# Altium footprint library LCD.PcbLib: 27 footprints (part 1 of 2)
Each footprint in its own frame and in the unit in brackets; x right, y up, seen from the top. Pads: shape width x height; smd on the part's side, far side on the other; paste and mask are expansions set on the pad; w line width, h text height; cw(c..) or ccw(c..) is an arc to the next point about the centre after c.
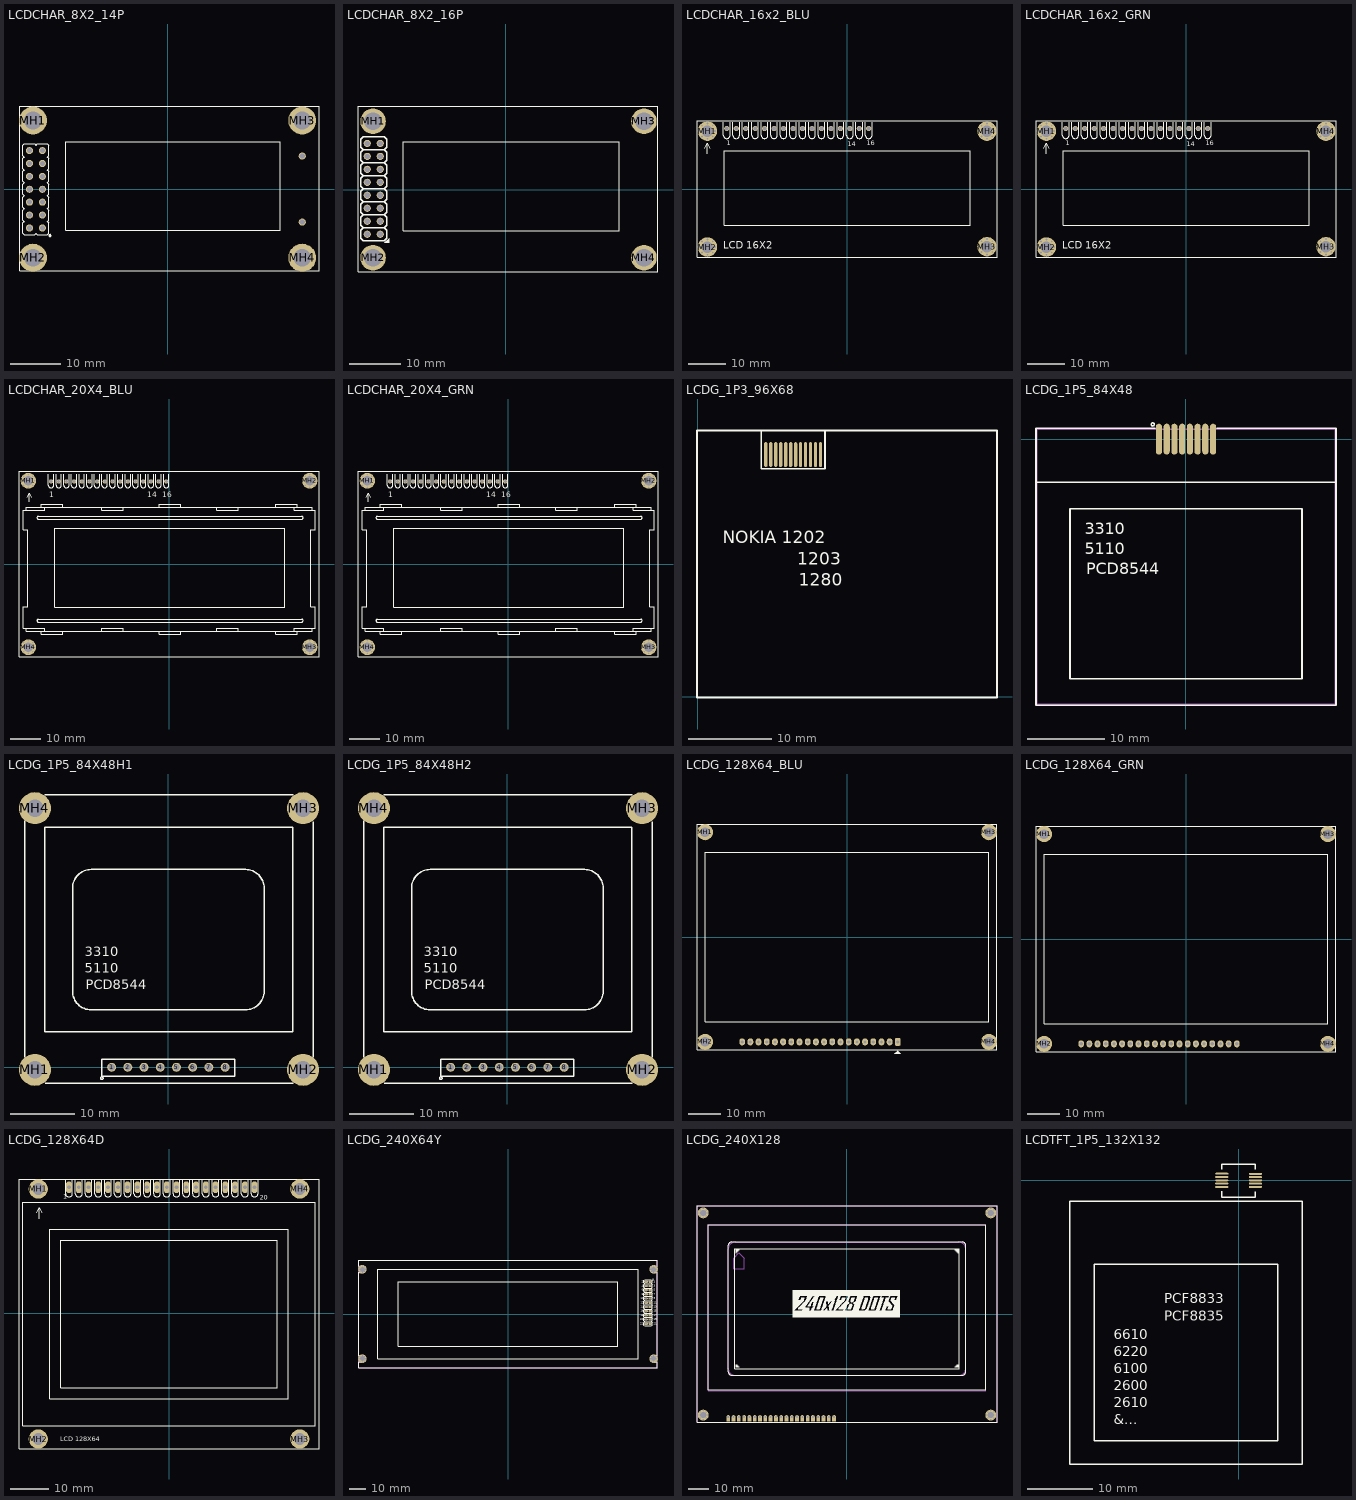
[diagram p0: the footprints below, top view; thin cyan lines are the x and y axes]

## LCDCHAR_8X2_14P [mm] "LCD Characters Display, 2linesX8char, header2x7 + 2"
pads (20):
  round 1.4 / inner round 1.4 / far side oval 2.2x1.4 hole 1 mask+0.1: 1(-24.65,-7.65) 2(-27.19,-7.65) 3(-24.65,-5.11) 4(-27.19,-5.11) 5(-24.65,-2.57) 6(-27.19,-2.57) 7(-24.65,-0.03) 8(-27.19,-0.03) 9(-24.65,2.51) 10(-27.19,2.51) 11(-24.65,5.05) 12(-27.19,5.05) 13(-24.65,7.59) 14(-27.19,7.59) 15(26.5,6.5) 16(26.5,-6.5)
  round 5.5 hole 3.5: MH1(-26.5,13.5) MH2(-26.5,-13.5) MH3(26.5,13.5) MH4(26.5,-13.5)
Top Overlay:
  circle w0.2: c-23.15,-9.13 r0.2
  lines w0.2: -28.19,-6.41 -28.49,-6.11 -28.49,-4.11 -28.19,-3.81 ; -28.19,-6.35 -28.49,-6.65 -28.49,-8.65 -28.19,-8.95 -26.19,-8.95 -25.89,-8.65 ; -28.19,-3.87 -28.49,-3.57 -28.49,-1.57 -28.19,-1.27 ; -28.19,-1.33 -28.49,-1.03 -28.49,0.97 -28.19,1.27 ; -28.19,1.21 -28.49,1.51 -28.49,3.51 -28.19,3.81 ; -28.19,3.75 -28.49,4.05 -28.49,6.05 -28.19,6.35 ; -28.19,6.29 -28.49,6.59 -28.49,8.59 -28.19,8.89 -26.19,8.89 -25.89,8.59 ; -25.95,-8.65 -25.65,-8.95 -23.65,-8.95 -23.35,-8.65 -23.35,-6.65 -23.65,-6.35 ; -25.95,8.59 -25.65,8.89 -23.65,8.89 -23.35,8.59 -23.35,6.59 -23.65,6.29 ; -23.65,-6.41 -23.35,-6.11 -23.35,-4.11 -23.65,-3.81 ; -23.65,-3.87 -23.35,-3.57 -23.35,-1.57 -23.65,-1.27 ; -23.65,-1.33 -23.35,-1.03 -23.35,0.97 -23.65,1.27 ; -23.65,1.21 -23.35,1.51 -23.35,3.51 -23.65,3.81 ; -23.65,3.75 -23.35,4.05 -23.35,6.05 -23.65,6.35 ; -29.1,-16.1 -29.1,16.3 29.8,16.3 29.8,-16.1 -29.1,-16.1 ; -20,-8.1 -20,9.3 22.2,9.3 22.2,-8.1 -20,-8.1
3D body "User Library-Header_Male_7Pin.STEP": height 8.54, standoff -3, extent -28.38,-8.92 -25.89,8.86
3D body "User Library-Header_Male_7Pin.STEP": height 8.54, standoff -3, extent -25.84,-8.92 -23.35,8.86
3D body "User Library-8x2 lcd.step": height 15.6, standoff 2.6, extent -29,-16 29,16

## LCDCHAR_8X2_16P [mm] "LCD Characters Display, 2linesX8char, header2x8"
pads (20):
  round 1.4 / inner round 1.4 / far side oval 2.2x1.4 hole 1: 1(-24.55,-8.75) 2(-27.09,-8.75) 3(-24.55,-6.21) 4(-27.09,-6.21) 5(-24.55,-3.67) 6(-27.09,-3.67) 7(-24.55,-1.13) 8(-27.09,-1.13) 9(-24.55,1.41) 10(-27.09,1.41) 11(-24.55,3.95) 12(-27.09,3.95) 13(-24.55,6.49) 14(-27.09,6.49) 15(-24.55,9.03) 16(-27.09,9.03)
  round 5 hole 3.5: MH1(-25.95,13.35) MH2(-25.95,-13.35) MH3(27.05,13.35) MH4(27.05,-13.35)
Top Overlay:
  region: -23.72,-10.46 -22.82,-10.46 -22.82,-9.56
  lines w0.2: -28.9,-16.1 29.8,-16.1 29.8,16.3 -28.9,16.3 -28.9,-16.1 ; -20,-8.1 22.2,-8.1 22.2,9.3 -20,9.3 -20,-8.1
  lines w0.254: -27.854,10.3 -23.79,10.3 -23.282,9.792 -23.282,8.267 -23.788,7.76 ; -27.852,-7.48 -28.362,-7.989 -28.362,-9.512 -27.854,-10.02 -23.788,-10.02 -23.282,-9.513 -23.282,-7.988 -23.79,-7.48 -27.854,-7.48 -28.362,-6.972 -28.362,-5.449 -27.852,-4.94 ; -27.852,-2.4 -28.362,-2.909 -28.362,-4.432 -27.854,-4.94 -23.79,-4.94 -23.282,-5.448 -23.282,-6.973 -23.788,-7.48 ; -27.852,0.14 -28.362,-0.369 -28.362,-1.892 -27.854,-2.4 -23.79,-2.4 -23.282,-2.908 -23.282,-4.433 -23.788,-4.94 ; -27.852,2.68 -28.362,2.171 -28.362,0.648 -27.854,0.14 -23.79,0.14 -23.282,-0.368 -23.282,-1.893 -23.788,-2.4 ; -27.852,5.22 -28.362,4.711 -28.362,3.188 -27.854,2.68 -23.79,2.68 -23.282,2.172 -23.282,0.647 -23.788,0.14 ; -27.852,7.76 -28.362,7.251 -28.362,5.728 -27.854,5.22 -23.79,5.22 -23.282,4.712 -23.282,3.187 -23.788,2.68 ; -27.852,10.3 -28.362,9.791 -28.362,8.268 -27.854,7.76 -23.79,7.76 -23.282,7.252 -23.282,5.727 -23.788,5.22
3D body "User Library-LCD0802.step": height 13.7, standoff 0.75, extent -28.8,-15.85 29.2,16.15
3D body "PIN.STEP": height 8.43, standoff -2.49, extent -25.82,-10.02 -23.28,-7.48
3D body "PIN_mid.STEP": height 8.43, standoff -2.49, extent -28.36,-4.94 -25.82,-2.4
3D body "PIN_mid.STEP": height 8.43, standoff -2.49, extent -28.36,-2.4 -25.82,0.14
3D body "PIN_mid.STEP": height 8.43, standoff -2.49, extent -28.36,0.14 -25.82,2.68
3D body "PIN_mid.STEP": height 8.43, standoff -2.49, extent -28.36,2.68 -25.82,5.22
3D body "PIN_mid.STEP": height 8.43, standoff -2.49, extent -28.36,5.22 -25.82,7.76
3D body "PIN_mid.STEP": height 8.43, standoff -2.49, extent -28.36,-7.48 -25.82,-4.94
3D body "PIN_mid.STEP": height 8.43, standoff -2.49, extent -25.82,-7.48 -23.28,-4.94
3D body "PIN_mid.STEP": height 8.43, standoff -2.49, extent -25.82,-4.94 -23.28,-2.4
3D body "PIN_mid.STEP": height 8.43, standoff -2.49, extent -25.82,-2.4 -23.28,0.14
3D body "PIN_mid.STEP": height 8.43, standoff -2.49, extent -25.82,0.14 -23.28,2.68
3D body "PIN_mid.STEP": height 8.43, standoff -2.49, extent -25.82,2.68 -23.28,5.22
3D body "PIN_mid.STEP": height 8.43, standoff -2.49, extent -25.82,5.22 -23.28,7.76
3D body "PIN.STEP": height 8.43, standoff -2.49, extent -28.36,-10.02 -25.82,-7.48
3D body "PIN.STEP": height 8.43, standoff -2.49, extent -28.36,7.76 -25.82,10.3
3D body "PIN.STEP": height 8.43, standoff -2.49, extent -25.82,7.76 -23.28,10.3

## LCDCHAR_16x2_BLU [mm] "LCD Characters Display, 2linesX16char, Blue, header1x16"
pads (20):
  round 1.4 / inner round 1.4 / far side oval 1.4x2.2 hole 1: 1(-32.3,16.25) 2(-29.76,16.25) 3(-27.22,16.25) 4(-24.68,16.25) 5(-22.14,16.25) 6(-19.6,16.25) 7(-17.06,16.25) 8(-14.52,16.25) 9(-11.98,16.25) 10(-9.44,16.25) 11(-6.9,16.25) 12(-4.36,16.25) 13(-1.82,16.25) 14(0.72,16.25) 15(3.26,16.25) 16(5.8,16.25)
  round 5.2 hole 3.1: MH1(-37.5,15.55) MH2(-37.5,-15.55) MH3(37.5,-15.45) MH4(37.5,15.55)
via 38.949,14.1 diameter 1 hole 0.5
via 37.5,13.5 diameter 1 hole 0.5
via 36.05,14.1 diameter 1 hole 0.5
via 35.45,15.55 diameter 1 hole 0.5
via 36.05,16.999 diameter 1 hole 0.5
via 37.5,17.6 diameter 1 hole 0.5
via 38.949,16.999 diameter 1 hole 0.5
via 39.55,15.55 diameter 1 hole 0.5
via 38.949,-16.9 diameter 1 hole 0.5
via 37.5,-17.5 diameter 1 hole 0.5
via 36.05,-16.9 diameter 1 hole 0.5
via 35.45,-15.45 diameter 1 hole 0.5
via 36.05,-14.001 diameter 1 hole 0.5
via 37.5,-13.4 diameter 1 hole 0.5
via 38.949,-14.001 diameter 1 hole 0.5
via 39.55,-15.45 diameter 1 hole 0.5
via -36.051,-17 diameter 1 hole 0.5
via -37.5,-17.6 diameter 1 hole 0.5
via -38.95,-17 diameter 1 hole 0.5
via -39.55,-15.55 diameter 1 hole 0.5
via -38.95,-14.101 diameter 1 hole 0.5
via -37.5,-13.5 diameter 1 hole 0.5
via -36.051,-14.101 diameter 1 hole 0.5
via -35.45,-15.55 diameter 1 hole 0.5
via -36.051,14.1 diameter 1 hole 0.5
via -37.5,13.5 diameter 1 hole 0.5
via -38.95,14.1 diameter 1 hole 0.5
via -39.55,15.55 diameter 1 hole 0.5
via -38.95,16.999 diameter 1 hole 0.5
via -37.5,17.6 diameter 1 hole 0.5
via -36.051,16.999 diameter 1 hole 0.5
via -35.45,15.55 diameter 1 hole 0.5
Top Overlay:
  lines w0.2: -38.154,11.016 -37.519,12.286 -36.884,11.016 ; -37.519,9.474 -37.519,12.159 ; -33.197,18.006 -33.197,14.45 ccw(c-32.308,14.45) -31.419,14.45 -31.419,18.006 ; -30.657,18.006 -30.657,14.45 ccw(c-29.768,14.45) -28.879,14.45 -28.879,18.006 ; -28.117,18.006 -28.117,14.45 ccw(c-27.228,14.45) -26.339,14.45 -26.339,18.006 ; -25.577,18.006 -25.577,14.45 ccw(c-24.688,14.45) -23.799,14.45 -23.799,18.006 ; -23.037,18.006 -23.037,14.45 ccw(c-22.148,14.45) -21.259,14.45 -21.259,18.006 ; -20.497,18.006 -20.497,14.45 ccw(c-19.608,14.45) -18.719,14.45 -18.719,18.006 ; -17.957,18.006 -17.957,14.45 ccw(c-17.068,14.45) -16.179,14.45 -16.179,18.006 ; -15.417,18.006 -15.417,14.45 ccw(c-14.528,14.45) -13.639,14.45 -13.639,18.006 ; -12.877,18.006 -12.877,14.45 ccw(c-11.988,14.45) -11.099,14.45 -11.099,18.006 ; -10.337,18.006 -10.337,14.45 ccw(c-9.448,14.45) -8.559,14.45 -8.559,18.006 ; -7.797,18.006 -7.797,14.45 ccw(c-6.908,14.45) -6.019,14.45 -6.019,18.006 ; -5.257,18.006 -5.257,14.45 ccw(c-4.368,14.45) -3.479,14.45 -3.479,18.006 ; -2.717,18.006 -2.717,14.45 ccw(c-1.828,14.45) -0.939,14.45 -0.939,18.006 ; -0.177,18.006 -0.177,14.45 ccw(c0.712,14.45) 1.601,14.45 1.601,18.006 ; 2.363,18.006 2.363,14.45 ccw(c3.252,14.45) 4.141,14.45 4.141,18.006 ; 4.903,18.006 4.903,14.45 ccw(c5.792,14.45) 6.681,14.45 6.681,18.006 ; -40.292,-18.218 -40.292,18.282 40.208,18.282 40.208,-18.218 -40.292,-18.218 ; -33,-9.65 -33,10.35 33,10.35 33,-9.65 -33,-9.65
  text "14" at 0.204,11.529 h1.27
  text "1" at -32.308,11.783 h1.27
  text "16" at 5.284,11.783 h1.27
  text "LCD 16X2" at -33.182,-15.946 h2
3D body "14801-15 H.STEP": height 18.71, standoff -3.71, extent -39.8,13.25 -35.2,17.85
3D body "14801-15 H.STEP": height 18.71, standoff -3.71, extent -39.8,-17.85 -35.2,-13.25
3D body "14801-15 H.STEP": height 18.71, standoff -3.71, extent 35.2,-17.75 39.8,-13.15
3D body "14801-15 H.STEP": height 18.71, standoff -3.71, extent 35.2,13.25 39.8,17.85
3D body "User Library-LCD-5.STEP": height 24.8, standoff 6.5, extent -40,-18 40,18
3D body "PBD-2.stp": height 8.5, standoff -3.15, extent 1.99,14.98 7.07,17.52
3D body "PBD-2.stp": height 8.5, standoff -3.15, extent -3.09,14.98 1.99,17.52
3D body "PBD-2.stp": height 8.5, standoff -3.15, extent -8.17,14.98 -3.09,17.52
3D body "PBD-2.stp": height 8.5, standoff -3.15, extent -13.25,14.98 -8.17,17.52
3D body "PBD-2.stp": height 8.5, standoff -3.15, extent -18.33,14.98 -13.25,17.52
3D body "PBD-2.stp": height 8.5, standoff -3.15, extent -23.41,14.98 -18.33,17.52
3D body "PBD-2.stp": height 8.5, standoff -3.15, extent -28.49,14.98 -23.41,17.52
3D body "PBD-2.stp": height 8.5, standoff -3.15, extent -33.57,14.98 -28.49,17.52

## LCDCHAR_16x2_GRN [mm] "LCD Characters Display, 2linesX16char, Green, header1x16"
pads (20):
  round 1.4 / inner round 1.4 / far side oval 1.4x2.2 hole 1: 1(-32.3,16.25) 2(-29.76,16.25) 3(-27.22,16.25) 4(-24.68,16.25) 5(-22.14,16.25) 6(-19.6,16.25) 7(-17.06,16.25) 8(-14.52,16.25) 9(-11.98,16.25) 10(-9.44,16.25) 11(-6.9,16.25) 12(-4.36,16.25) 13(-1.82,16.25) 14(0.72,16.25) 15(3.26,16.25) 16(5.8,16.25)
  round 5.2 hole 3.1: MH1(-37.5,15.55) MH2(-37.5,-15.55) MH3(37.5,-15.45) MH4(37.5,15.55)
via -35.45,15.55 diameter 1 hole 0.5
via -36.051,16.999 diameter 1 hole 0.5
via -37.5,17.6 diameter 1 hole 0.5
via -38.95,16.999 diameter 1 hole 0.5
via -39.55,15.55 diameter 1 hole 0.5
via -38.95,14.1 diameter 1 hole 0.5
via -37.5,13.5 diameter 1 hole 0.5
via -36.051,14.1 diameter 1 hole 0.5
via -35.45,-15.55 diameter 1 hole 0.5
via -36.051,-14.101 diameter 1 hole 0.5
via -37.5,-13.5 diameter 1 hole 0.5
via -38.95,-14.101 diameter 1 hole 0.5
via -39.55,-15.55 diameter 1 hole 0.5
via -38.95,-17 diameter 1 hole 0.5
via -37.5,-17.6 diameter 1 hole 0.5
via -36.051,-17 diameter 1 hole 0.5
via 39.55,-15.45 diameter 1 hole 0.5
via 38.949,-14.001 diameter 1 hole 0.5
via 37.5,-13.4 diameter 1 hole 0.5
via 36.05,-14.001 diameter 1 hole 0.5
via 35.45,-15.45 diameter 1 hole 0.5
via 36.05,-16.9 diameter 1 hole 0.5
via 37.5,-17.5 diameter 1 hole 0.5
via 38.949,-16.9 diameter 1 hole 0.5
via 39.55,15.55 diameter 1 hole 0.5
via 38.949,16.999 diameter 1 hole 0.5
via 37.5,17.6 diameter 1 hole 0.5
via 36.05,16.999 diameter 1 hole 0.5
via 35.45,15.55 diameter 1 hole 0.5
via 36.05,14.1 diameter 1 hole 0.5
via 37.5,13.5 diameter 1 hole 0.5
via 38.949,14.1 diameter 1 hole 0.5
Top Overlay:
  lines w0.2: -38.154,11.016 -37.519,12.286 -36.884,11.016 ; -37.519,9.474 -37.519,12.159 ; -33.197,18.006 -33.197,14.45 ccw(c-32.308,14.45) -31.419,14.45 -31.419,18.006 ; -30.657,18.006 -30.657,14.45 ccw(c-29.768,14.45) -28.879,14.45 -28.879,18.006 ; -28.117,18.006 -28.117,14.45 ccw(c-27.228,14.45) -26.339,14.45 -26.339,18.006 ; -25.577,18.006 -25.577,14.45 ccw(c-24.688,14.45) -23.799,14.45 -23.799,18.006 ; -23.037,18.006 -23.037,14.45 ccw(c-22.148,14.45) -21.259,14.45 -21.259,18.006 ; -20.497,18.006 -20.497,14.45 ccw(c-19.608,14.45) -18.719,14.45 -18.719,18.006 ; -17.957,18.006 -17.957,14.45 ccw(c-17.068,14.45) -16.179,14.45 -16.179,18.006 ; -15.417,18.006 -15.417,14.45 ccw(c-14.528,14.45) -13.639,14.45 -13.639,18.006 ; -12.877,18.006 -12.877,14.45 ccw(c-11.988,14.45) -11.099,14.45 -11.099,18.006 ; -10.337,18.006 -10.337,14.45 ccw(c-9.448,14.45) -8.559,14.45 -8.559,18.006 ; -7.797,18.006 -7.797,14.45 ccw(c-6.908,14.45) -6.019,14.45 -6.019,18.006 ; -5.257,18.006 -5.257,14.45 ccw(c-4.368,14.45) -3.479,14.45 -3.479,18.006 ; -2.717,18.006 -2.717,14.45 ccw(c-1.828,14.45) -0.939,14.45 -0.939,18.006 ; -0.177,18.006 -0.177,14.45 ccw(c0.712,14.45) 1.601,14.45 1.601,18.006 ; 2.363,18.006 2.363,14.45 ccw(c3.252,14.45) 4.141,14.45 4.141,18.006 ; 4.903,18.006 4.903,14.45 ccw(c5.792,14.45) 6.681,14.45 6.681,18.006 ; -40.292,-18.218 40.208,-18.218 40.208,18.282 -40.292,18.282 -40.292,-18.218 ; -33,-9.65 33,-9.65 33,10.35 -33,10.35 -33,-9.65
  text "LCD 16X2" at -33.182,-15.946 h2
  text "16" at 5.284,11.783 h1.27
  text "1" at -32.308,11.783 h1.27
  text "14" at 0.204,11.529 h1.27
3D body "LCD 16x2 JHD162A.step": height 25.6, standoff 12.45, extent -39.997,-18.01 40.003,17.99
3D body "PBD-2.stp": height 8.5, standoff -3.15, extent -33.57,14.98 -28.49,17.52
3D body "PBD-2.stp": height 8.5, standoff -3.15, extent -28.49,14.98 -23.41,17.52
3D body "PBD-2.stp": height 8.5, standoff -3.15, extent -23.41,14.98 -18.33,17.52
3D body "PBD-2.stp": height 8.5, standoff -3.15, extent -18.33,14.98 -13.25,17.52
3D body "PBD-2.stp": height 8.5, standoff -3.15, extent -13.25,14.98 -8.17,17.52
3D body "PBD-2.stp": height 8.5, standoff -3.15, extent -8.17,14.98 -3.09,17.52
3D body "PBD-2.stp": height 8.5, standoff -3.15, extent -3.09,14.98 1.99,17.52
3D body "PBD-2.stp": height 8.5, standoff -3.15, extent 1.99,14.98 7.07,17.52
3D body "14801-15 H.STEP": height 18.71, standoff -3.71, extent 35.2,13.25 39.8,17.85
3D body "14801-15 H.STEP": height 18.71, standoff -3.71, extent 35.2,-17.75 39.8,-13.15
3D body "14801-15 H.STEP": height 18.71, standoff -3.71, extent -39.8,-17.85 -35.2,-13.25
3D body "14801-15 H.STEP": height 18.71, standoff -3.71, extent -39.8,13.25 -35.2,17.85

## LCDCHAR_20X4_BLU [mm] "LCD Characters Display, 4linesX20char, Blue, header1x16"
pads (20):
  round 1.4 / inner round 1.4 / far side oval 1.4x2.2 hole 1: 1(-39,27.3) 2(-36.46,27.3) 3(-33.92,27.3) 4(-31.38,27.3) 5(-28.84,27.3) 6(-26.3,27.3) 7(-23.76,27.3) 8(-21.22,27.3) 9(-18.68,27.3) 10(-16.14,27.3) 11(-13.6,27.3) 12(-11.06,27.3) 13(-8.52,27.3) 14(-5.98,27.3) 15(-3.44,27.3) 16(-0.9,27.3)
  round 5.2 hole 3.1: MH1(-46.5,27.5) MH2(46.5,27.5) MH3(46.5,-27.5) MH4(-46.5,-27.5)
via -44.45,27.5 diameter 1 hole 0.5
via -45.051,28.949 diameter 1 hole 0.5
via -46.5,29.55 diameter 1 hole 0.5
via -47.95,28.949 diameter 1 hole 0.5
via -48.55,27.5 diameter 1 hole 0.5
via -47.95,26.05 diameter 1 hole 0.5
via -46.5,25.45 diameter 1 hole 0.5
via -45.051,26.05 diameter 1 hole 0.5
via 47.95,26.05 diameter 1 hole 0.5
via 46.5,25.45 diameter 1 hole 0.5
via 45.05,26.05 diameter 1 hole 0.5
via 44.45,27.5 diameter 1 hole 0.5
via 45.05,28.95 diameter 1 hole 0.5
via 46.5,29.55 diameter 1 hole 0.5
via 47.95,28.95 diameter 1 hole 0.5
via 48.55,27.5 diameter 1 hole 0.5
via 47.949,-28.95 diameter 1 hole 0.5
via 46.5,-29.55 diameter 1 hole 0.5
via 45.05,-28.95 diameter 1 hole 0.5
via 44.45,-27.5 diameter 1 hole 0.5
via 45.05,-26.051 diameter 1 hole 0.5
via 46.5,-25.45 diameter 1 hole 0.5
via 47.949,-26.051 diameter 1 hole 0.5
via 48.55,-27.5 diameter 1 hole 0.5
via -45.051,-28.95 diameter 1 hole 0.5
via -46.5,-29.55 diameter 1 hole 0.5
via -47.95,-28.95 diameter 1 hole 0.5
via -48.55,-27.5 diameter 1 hole 0.5
via -47.95,-26.051 diameter 1 hole 0.5
via -46.5,-25.45 diameter 1 hole 0.5
via -45.051,-26.051 diameter 1 hole 0.5
via -44.45,-27.5 diameter 1 hole 0.5
Top Overlay:
  lines w0.2: -46.874,22.13 -46.239,23.4 -45.604,22.13 ; -46.239,20.588 -46.239,23.273 ; -39.889,29.623 -39.889,26.067 ccw(c-39,26.067) -38.111,26.067 -38.111,29.623 ; -37.349,29.623 -37.349,26.067 ccw(c-36.46,26.067) -35.571,26.067 -35.571,29.623 ; -34.809,29.623 -34.809,26.067 ccw(c-33.92,26.067) -33.031,26.067 -33.031,29.623 ; -32.269,29.623 -32.269,26.067 ccw(c-31.38,26.067) -30.491,26.067 -30.491,29.623 ; -29.729,29.623 -29.729,26.067 ccw(c-28.84,26.067) -27.951,26.067 -27.951,29.623 ; -27.189,29.623 -27.189,26.067 ccw(c-26.3,26.067) -25.411,26.067 -25.411,29.623 ; -24.713,29.623 -24.713,26.067 ccw(c-23.824,26.067) -22.935,26.067 -22.935,29.623 ; -22.173,29.623 -22.173,26.067 ccw(c-21.284,26.067) -20.395,26.067 -20.395,29.623 ; -19.569,29.623 -19.569,26.067 ccw(c-18.68,26.067) -17.791,26.067 -17.791,29.623 ; -17.029,29.623 -17.029,26.067 ccw(c-16.14,26.067) -15.251,26.067 -15.251,29.623 ; -14.489,29.623 -14.489,26.067 ccw(c-13.6,26.067) -12.711,26.067 -12.711,29.623 ; -11.949,29.623 -11.949,26.067 ccw(c-11.06,26.067) -10.171,26.067 -10.171,29.623 ; -9.409,29.623 -9.409,26.067 ccw(c-8.52,26.067) -7.631,26.067 -7.631,29.623 ; -6.869,29.623 -6.869,26.067 ccw(c-5.98,26.067) -5.091,26.067 -5.091,29.623 ; -4.393,29.623 -4.393,26.067 ccw(c-3.504,26.067) -2.615,26.067 -2.615,29.623 ; -1.789,29.623 -1.789,26.067 ccw(c-0.9,26.067) -0.011,26.067 -0.011,29.623 ; -47.16,-21.21 -48.16,-21.21 -48.16,-14.21 -46.66,-14.21 -46.66,11.289 -48.16,11.289 -48.16,17.789 -47.16,17.789 ; -47.16,-21.21 -41.16,-21.21 -41.16,-22.211 ; -47.16,-21.21 -47.16,-22.211 -42.16,-22.211 ; -47.16,17.789 -41.16,17.789 -41.16,18.79 ; -47.16,17.789 -47.16,18.79 -42.16,18.79 ; -42.16,-22.211 -41.16,-22.211 ; -42.16,-22.211 -42.16,-23.212 -35.16,-23.212 -35.16,-22.211 ; -42.16,18.79 -41.16,18.79 ; -42.16,18.79 -42.16,19.788 -35.16,19.788 -35.16,18.79 ; -41.16,-22.211 -35.16,-22.211 ; -41.16,18.79 -35.16,18.79 ; -35.16,-22.211 -22.16,-22.211 ; -35.16,18.79 -22.16,18.79 ; -22.16,-22.211 -15.16,-22.211 ; -22.16,-22.211 -22.16,-21.21 -15.16,-21.21 -15.16,-22.211 ; -22.16,18.79 -15.16,18.79 ; -22.16,18.79 -22.16,17.789 -15.16,17.789 -15.16,18.79 ; -15.16,-22.211 -3.16,-22.211 ; -15.16,18.79 -3.16,18.79 ; -3.16,-22.211 3.84,-22.211 ; -3.16,-22.211 -3.16,-23.212 3.84,-23.212 3.84,-22.211 ; -3.16,18.79 3.84,18.79 ; -3.16,18.79 -3.16,19.788 3.84,19.788 3.84,18.79 ; 3.84,-22.211 15.84,-22.211 ; 3.84,18.79 15.84,18.79 ; 15.84,-22.211 22.84,-22.211 ; 15.84,-22.211 15.84,-21.21 22.84,-21.21 22.84,-22.211 ; 15.84,18.79 22.84,18.79 ; 15.84,18.79 15.84,17.789 22.84,17.789 22.84,18.79 ; 22.84,-22.211 35.34,-22.211 ; 22.84,18.79 35.34,18.79 ; 35.34,-22.211 41.34,-22.211 ; 35.34,-22.211 35.34,-23.212 42.34,-23.212 42.34,-22.211 ; 35.34,18.79 41.34,18.79 ; 35.34,18.79 35.34,19.788 42.34,19.788 42.34,18.79 ; 41.34,-22.211 42.34,-22.211 ; 41.34,-22.211 41.34,-21.21 47.34,-21.21 ; 41.34,18.79 42.34,18.79 ; 41.34,18.79 41.34,17.789 47.34,17.789 ; 42.34,-22.211 47.34,-22.211 47.34,-21.21 ; 42.34,18.79 47.34,18.79 47.34,17.789 ; 47.34,-21.21 48.34,-21.21 48.34,-14.21 46.84,-14.21 46.84,11.289 48.34,11.289 48.34,17.789 47.34,17.789 ; -43.16,-19.211 cw(c-43.16,-18.711) -43.16,-18.211 43.84,-18.21 cw(c43.84,-18.711) 43.84,-19.211 -43.16,-19.211 ; -43.16,14.79 cw(c-43.16,15.29) -43.16,15.79 43.84,15.79 cw(c43.84,15.29) 43.84,14.79 -43.16,14.789 ; -37.71,-14.301 38.3,-14.301 38.3,11.759 -37.71,11.759 -37.71,-14.301
  lines w0.254: -49.6,-30.6 49.6,-30.6 49.6,30.6 -49.6,30.6 -49.6,-30.6
  text "1" at -39.635,22.13 h1.78
  text "16" at -2.17,22.13 h1.78
  text "14" at -7.25,22.13 h1.78
3D body "PBD-2.stp": height 8.5, standoff -3.15, extent -40.27,26.03 -35.19,28.57
3D body "PBD-2.stp": height 8.5, standoff -3.15, extent -35.19,26.03 -30.11,28.57
3D body "PBD-2.stp": height 8.5, standoff -3.15, extent -30.11,26.03 -25.03,28.57
3D body "PBD-2.stp": height 8.5, standoff -3.15, extent -25.03,26.03 -19.95,28.57
3D body "PBD-2.stp": height 8.5, standoff -3.15, extent -19.95,26.03 -14.87,28.57
3D body "PBD-2.stp": height 8.5, standoff -3.15, extent -14.87,26.03 -9.79,28.57
3D body "PBD-2.stp": height 8.5, standoff -3.15, extent -9.79,26.03 -4.71,28.57
3D body "PBD-2.stp": height 8.5, standoff -3.15, extent -4.71,26.03 0.37,28.57
3D body "14801-15 H.STEP": height 18.71, standoff -3.71, extent -48.8,25.2 -44.2,29.8
3D body "14801-15 H.STEP": height 18.71, standoff -3.71, extent -48.8,-29.8 -44.2,-25.2
3D body "14801-15 H.STEP": height 18.71, standoff -3.71, extent 44.2,-29.8 48.8,-25.2
3D body "14801-15 H.STEP": height 18.71, standoff -3.71, extent 44.2,25.2 48.8,29.8
3D body "User Library-LCD 20 x 4.STEP": height 26.17, standoff 15.07, extent -49,-30 49,30

## LCDCHAR_20X4_GRN [mm] "LCD Characters Display, 4linesX20char, Green, header1x16"
pads (20):
  round 1.4 / inner round 1.4 / far side oval 1.4x2.2 hole 1: 1(-39,27.3) 2(-36.46,27.3) 3(-33.92,27.3) 4(-31.38,27.3) 5(-28.84,27.3) 6(-26.3,27.3) 7(-23.76,27.3) 8(-21.22,27.3) 9(-18.68,27.3) 10(-16.14,27.3) 11(-13.6,27.3) 12(-11.06,27.3) 13(-8.52,27.3) 14(-5.98,27.3) 15(-3.44,27.3) 16(-0.9,27.3)
  round 5.2 hole 3.1: MH1(-46.5,27.5) MH2(46.5,27.5) MH3(46.5,-27.5) MH4(-46.5,-27.5)
via -44.45,-27.5 diameter 1 hole 0.5
via -45.051,-26.051 diameter 1 hole 0.5
via -46.5,-25.45 diameter 1 hole 0.5
via -47.95,-26.051 diameter 1 hole 0.5
via -48.55,-27.5 diameter 1 hole 0.5
via -47.95,-28.95 diameter 1 hole 0.5
via -46.5,-29.55 diameter 1 hole 0.5
via -45.051,-28.95 diameter 1 hole 0.5
via 48.55,-27.5 diameter 1 hole 0.5
via 47.949,-26.051 diameter 1 hole 0.5
via 46.5,-25.45 diameter 1 hole 0.5
via 45.05,-26.051 diameter 1 hole 0.5
via 44.45,-27.5 diameter 1 hole 0.5
via 45.05,-28.95 diameter 1 hole 0.5
via 46.5,-29.55 diameter 1 hole 0.5
via 47.949,-28.95 diameter 1 hole 0.5
via 48.55,27.5 diameter 1 hole 0.5
via 47.95,28.95 diameter 1 hole 0.5
via 46.5,29.55 diameter 1 hole 0.5
via 45.05,28.95 diameter 1 hole 0.5
via 44.45,27.5 diameter 1 hole 0.5
via 45.05,26.05 diameter 1 hole 0.5
via 46.5,25.45 diameter 1 hole 0.5
via 47.95,26.05 diameter 1 hole 0.5
via -45.051,26.05 diameter 1 hole 0.5
via -46.5,25.45 diameter 1 hole 0.5
via -47.95,26.05 diameter 1 hole 0.5
via -48.55,27.5 diameter 1 hole 0.5
via -47.95,28.949 diameter 1 hole 0.5
via -46.5,29.55 diameter 1 hole 0.5
via -45.051,28.949 diameter 1 hole 0.5
via -44.45,27.5 diameter 1 hole 0.5
Top Overlay:
  lines w0.2: -46.874,22.13 -46.239,23.4 -45.604,22.13 ; -46.239,20.588 -46.239,23.273 ; -39.889,29.623 -39.889,26.067 ccw(c-39,26.067) -38.111,26.067 -38.111,29.623 ; -37.349,29.623 -37.349,26.067 ccw(c-36.46,26.067) -35.571,26.067 -35.571,29.623 ; -34.809,29.623 -34.809,26.067 ccw(c-33.92,26.067) -33.031,26.067 -33.031,29.623 ; -32.269,29.623 -32.269,26.067 ccw(c-31.38,26.067) -30.491,26.067 -30.491,29.623 ; -29.729,29.623 -29.729,26.067 ccw(c-28.84,26.067) -27.951,26.067 -27.951,29.623 ; -27.189,29.623 -27.189,26.067 ccw(c-26.3,26.067) -25.411,26.067 -25.411,29.623 ; -24.713,29.623 -24.713,26.067 ccw(c-23.824,26.067) -22.935,26.067 -22.935,29.623 ; -22.173,29.623 -22.173,26.067 ccw(c-21.284,26.067) -20.395,26.067 -20.395,29.623 ; -19.569,29.623 -19.569,26.067 ccw(c-18.68,26.067) -17.791,26.067 -17.791,29.623 ; -17.029,29.623 -17.029,26.067 ccw(c-16.14,26.067) -15.251,26.067 -15.251,29.623 ; -14.489,29.623 -14.489,26.067 ccw(c-13.6,26.067) -12.711,26.067 -12.711,29.623 ; -11.949,29.623 -11.949,26.067 ccw(c-11.06,26.067) -10.171,26.067 -10.171,29.623 ; -9.409,29.623 -9.409,26.067 ccw(c-8.52,26.067) -7.631,26.067 -7.631,29.623 ; -6.869,29.623 -6.869,26.067 ccw(c-5.98,26.067) -5.091,26.067 -5.091,29.623 ; -4.393,29.623 -4.393,26.067 ccw(c-3.504,26.067) -2.615,26.067 -2.615,29.623 ; -1.789,29.623 -1.789,26.067 ccw(c-0.9,26.067) -0.011,26.067 -0.011,29.623 ; -47.16,-21.21 -47.16,-22.211 -42.16,-22.211 ; -47.16,-21.21 -41.16,-21.21 -41.16,-22.211 ; -47.16,-21.21 -48.16,-21.21 -48.16,-14.21 -46.66,-14.21 -46.66,11.289 -48.16,11.289 -48.16,17.789 -47.16,17.789 ; -47.16,17.789 -47.16,18.79 -42.16,18.79 ; -47.16,17.789 -41.16,17.789 -41.16,18.79 ; -42.16,-22.211 -42.16,-23.212 -35.16,-23.212 -35.16,-22.211 ; -42.16,-22.211 -41.16,-22.211 ; -42.16,18.79 -42.16,19.788 -35.16,19.788 -35.16,18.79 ; -42.16,18.79 -41.16,18.79 ; -41.16,-22.211 -35.16,-22.211 ; -41.16,18.79 -35.16,18.79 ; -35.16,-22.211 -22.16,-22.211 ; -35.16,18.79 -22.16,18.79 ; -22.16,-22.211 -22.16,-21.21 -15.16,-21.21 -15.16,-22.211 ; -22.16,-22.211 -15.16,-22.211 ; -22.16,18.79 -22.16,17.789 -15.16,17.789 -15.16,18.79 ; -22.16,18.79 -15.16,18.79 ; -15.16,-22.211 -3.16,-22.211 ; -15.16,18.79 -3.16,18.79 ; -3.16,-22.211 -3.16,-23.212 3.84,-23.212 3.84,-22.211 ; -3.16,-22.211 3.84,-22.211 ; -3.16,18.79 -3.16,19.788 3.84,19.788 3.84,18.79 ; -3.16,18.79 3.84,18.79 ; 3.84,-22.211 15.84,-22.211 ; 3.84,18.79 15.84,18.79 ; 15.84,-22.211 15.84,-21.21 22.84,-21.21 22.84,-22.211 ; 15.84,-22.211 22.84,-22.211 ; 15.84,18.79 15.84,17.789 22.84,17.789 22.84,18.79 ; 15.84,18.79 22.84,18.79 ; 22.84,-22.211 35.34,-22.211 ; 22.84,18.79 35.34,18.79 ; 35.34,-22.211 35.34,-23.212 42.34,-23.212 42.34,-22.211 ; 35.34,-22.211 41.34,-22.211 ; 35.34,18.79 35.34,19.788 42.34,19.788 42.34,18.79 ; 35.34,18.79 41.34,18.79 ; 41.34,-22.211 41.34,-21.21 47.34,-21.21 ; 41.34,-22.211 42.34,-22.211 ; 41.34,18.79 41.34,17.789 47.34,17.789 ; 41.34,18.79 42.34,18.79 ; 42.34,-22.211 47.34,-22.211 47.34,-21.21 ; 42.34,18.79 47.34,18.79 47.34,17.789 ; 47.34,-21.21 48.34,-21.21 48.34,-14.21 46.84,-14.21 46.84,11.289 48.34,11.289 48.34,17.789 47.34,17.789 ; -43.16,-19.211 cw(c-43.16,-18.711) -43.16,-18.211 43.84,-18.21 cw(c43.84,-18.711) 43.84,-19.211 -43.16,-19.211 ; -43.16,14.79 cw(c-43.16,15.29) -43.16,15.79 43.84,15.79 cw(c43.84,15.29) 43.84,14.79 -43.16,14.789 ; -37.71,-14.301 -37.71,11.759 38.3,11.759 38.3,-14.301 -37.71,-14.301